# Altium footprint library Module.PcbLib: 42 footprints (part 3 of 3)
Each footprint in its own frame and in the unit in brackets; x right, y up, seen from the top. Pads: shape width x height; smd on the part's side, far side on the other; paste and mask are expansions set on the pad; w line width, h text height; cw(c..) or ccw(c..) is an arc to the next point about the centre after c.
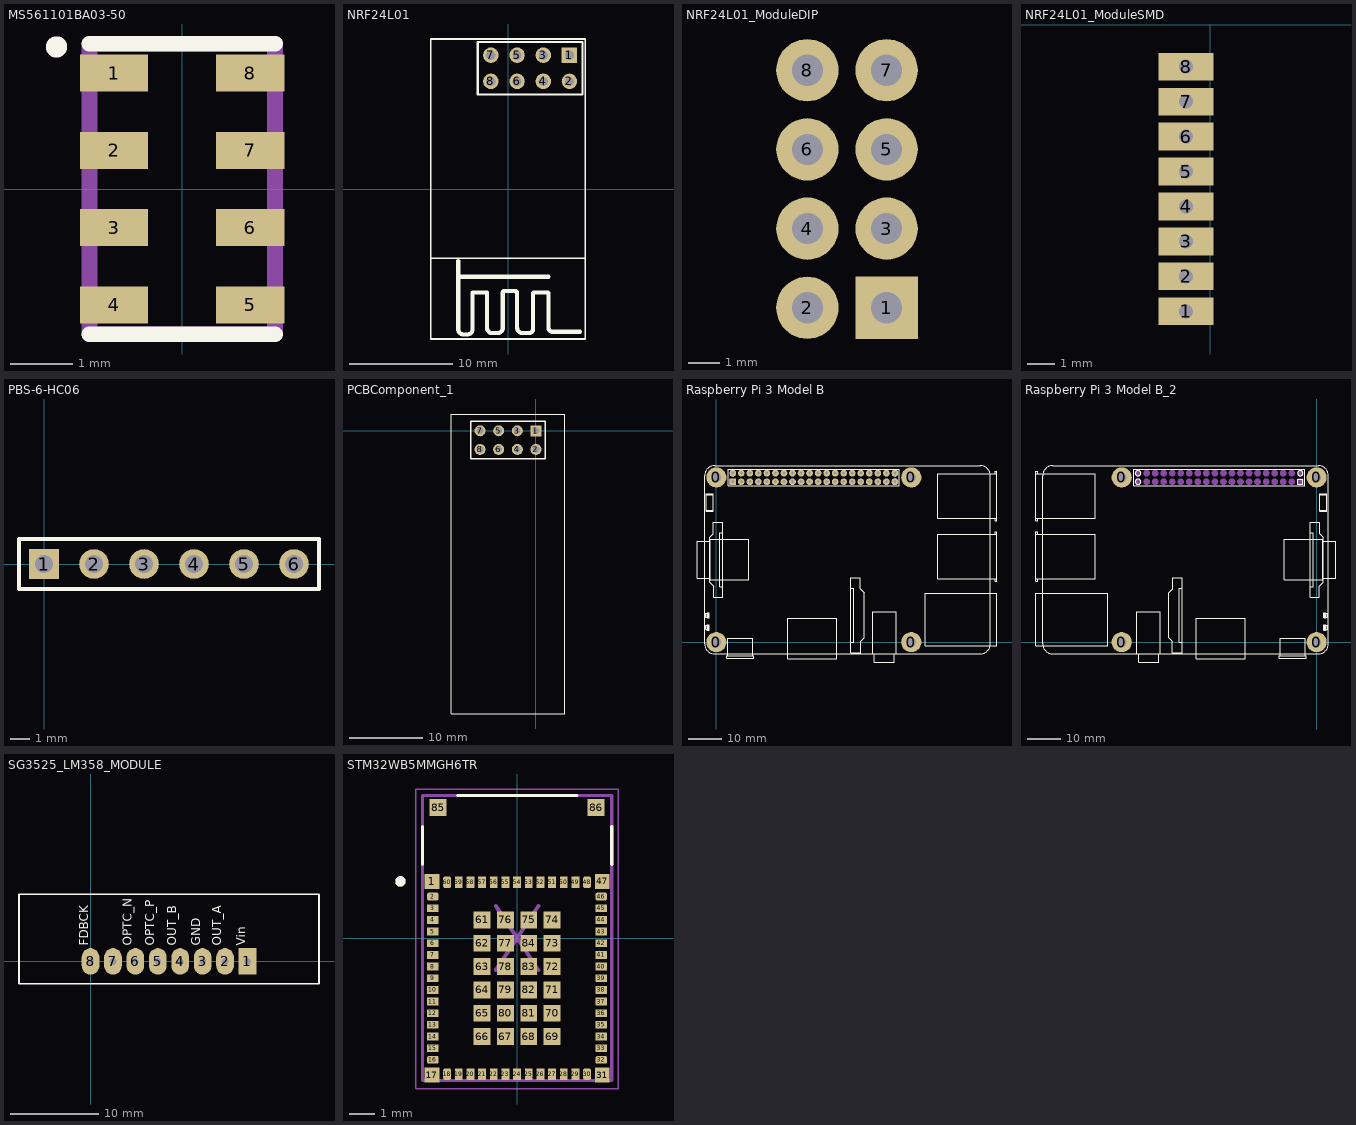
[diagram p2: the footprints below, top view; thin cyan lines are the x and y axes]

## MS561101BA03-50 [mm]
pads (8):
  rect 1.1x0.6 smd: 1(-1.1,1.875) 2(-1.1,0.625) 3(-1.1,-0.625) 4(-1.1,-1.875) 5(1.1,-1.875) 6(1.1,-0.625) 7(1.1,0.625) 8(1.1,1.875)
Top Overlay:
  circle w0.254: c-2.032,2.297 r0.045
  lines w0.254: -1.5,-2.35 1.5,-2.35 ; -1.5,2.35 1.5,2.35
Mechanical 13:
  lines w0.254: -1.5,-2.35 -1.5,2.35 1.5,2.35 1.5,-2.35 -1.5,-2.35
3D body "MS561101BA03-50.stp": height 0.95, standoff 0, extent -1.5,-2.5 1.5,2.5

## NRF24L01 [mm]
pads (8):
  rect 1.5x1.5 hole 0.9: 1(5.96,12.97)
  round 1.5 hole 0.9: 2(5.96,10.429) 3(3.42,12.97) 4(3.42,10.429) 5(0.88,12.97) 6(0.88,10.43) 7(-1.66,12.97) 8(-1.66,10.43)
Top Overlay:
  lines w0.15: -7.493,-6.731 7.493,-6.731 ; -7.493,-14.541 -7.493,14.541 7.493,14.541 7.493,-14.541 -7.493,-14.541
  lines w0.2: -2.93,9.16 7.23,9.16 7.23,14.24 -2.93,14.24 -2.93,9.16
  lines w0.4: -4.826,-8.509 3.937,-8.509 ; -4.826,-6.985 -4.826,-13.589 ccw(c-4.318,-13.589) -4.318,-14.097 -3.937,-14.097 ccw(c-3.937,-13.589) -3.429,-13.589 -3.429,-10.09 cw(c-3.372,-10.09) -3.372,-10.033 -2.089,-10.033 cw(c-2.089,-10.09) -2.032,-10.09 -2.032,-13.462 ccw(c-1.524,-13.462) -1.524,-13.97 -1.016,-13.97 ccw(c-1.016,-13.462) -0.508,-13.462 -0.508,-10.033 cw(c-0.381,-10.033) -0.381,-9.906 0.705,-9.906 cw(c0.705,-10.09) 0.889,-10.09 0.889,-13.462 ccw(c1.397,-13.462) 1.397,-13.97 2.032,-13.97 ccw(c2.032,-13.589) 2.413,-13.589 2.413,-10.16 cw(c2.54,-10.16) 2.54,-10.033 3.81,-10.033 cw(c3.81,-10.16) 3.937,-10.16 3.937,-13.462 ccw(c4.318,-13.462) 4.318,-13.843 6.985,-13.843
3D body "User Library-NRF24L01.STEP": height 8.5, standoff -3.95, extent -7.5,-14.458 7.5,14.541

## NRF24L01_ModuleDIP [mm]
pads (8):
  rect 2x2 hole 1: 1(27.94,2.54)
  round 2 hole 1: 2(25.4,2.54) 3(27.94,5.08) 4(25.4,5.08) 5(27.94,7.62) 6(25.4,7.62) 7(27.94,10.16) 8(25.4,10.16)
3D body "User Library-NRF24L01.STEP": height 3.5, standoff -8.95, extent 0,0 29,15

## NRF24L01_ModuleSMD [mm] "NRF24L01+ smd Module"
pads (8):
  rect 2x1 hole 0.5: 1(-0.889,-10.414) 2(-0.889,-9.144) 3(-0.889,-7.874) 4(-0.889,-6.604) 5(-0.889,-5.334) 6(-0.889,-4.064) 7(-0.889,-2.794) 8(-0.889,-1.524)
3D body "User Library-4-11.step": height 0.8, standoff 0, extent -18,-12 0,0

## PBS-6-HC06 [mm] "Connector; Header; 6 Position"
height 8
pads (6):
  rect 1.5x1.5 hole 0.9: 1(0,0)
  round 1.5 hole 0.9: 2(2.54,0) 3(5.08,0) 4(7.62,0) 5(10.16,0) 6(12.7,0)
Top Overlay:
  lines w0.2: -1.27,-1.27 13.97,-1.27 13.97,1.27 -1.27,1.27 -1.27,-1.27
3D body "User Library-HC05-Bluetooth.step": height 11.12, standoff 9.25, extent -1.625,-1.422 14.375,34.578
3D body "PBD-2.stp": height 8.5, standoff -3.15, extent -1.27,-1.27 3.81,1.27
3D body "PBD-2.stp": height 8.5, standoff -3.15, extent 3.81,-1.27 8.89,1.27
3D body "PBD-2.stp": height 8.5, standoff -3.15, extent 8.89,-1.27 13.97,1.27
3D body "User Library-PLS-6.step": height 12, standoff 0.46, extent -1.27,-1.27 13.97,1.27

## PCBComponent_1 [mm]
pads (8):
  rect 1.5x1.5 hole 0.9: 1(0,0)
  round 1.5 hole 0.9: 2(0,-2.54) 3(-2.54,0) 4(-2.54,-2.54) 5(-5.08,0) 6(-5.08,-2.54) 7(-7.62,0) 8(-7.62,-2.54)
Top Overlay:
  lines w0.15: -11.557,-38.608 -11.557,2.286 3.937,2.286 3.937,-38.608 -11.557,-38.608
  lines w0.2: -8.89,-3.81 1.27,-3.81 1.27,1.27 -8.89,1.27 -8.89,-3.81
3D body "User Library-NRF24+SMA.STEP": height 92.44, standoff -5.09, extent -11.493,-72.629 3.907,2.231

## Raspberry Pi 3 Model B [mm]
pads (44):
  round 6 hole 2.75 unplated: 0(0,0) 0(0,49) 0(58,0) 0(58,49)
  rect 2x2 hole 0.9: 1(4.87,47.73)
  round 2 hole 0.9: 2(4.87,50.27) 3(7.41,47.73) 4(7.41,50.27) 5(9.95,47.73) 6(9.95,50.27) 7(12.49,47.73) 8(12.49,50.27) 9(15.03,47.73) 10(15.03,50.27) 11(17.57,47.73) 12(17.57,50.27) 13(20.11,47.73) 14(20.11,50.27) 15(22.65,47.73) 16(22.65,50.27) 17(25.19,47.73) 18(25.19,50.27) 19(27.73,47.73) 20(27.73,50.27) 21(30.27,47.73) 22(30.27,50.27) 23(32.81,47.73) 24(32.81,50.27) 25(35.35,47.73) 26(35.35,50.27) 27(37.89,47.73) 28(37.89,50.27) 29(40.43,47.73) 30(40.43,50.27) 31(42.97,47.73) 32(42.97,50.27) 33(45.51,47.73) 34(45.51,50.27) 35(48.05,47.73) 36(48.05,50.27) 37(50.59,47.73) 38(50.59,50.27) 39(53.13,47.73) 40(53.13,50.27)
Top Overlay:
  circle w0.013: c4.87,50.27 r0.8
  circle w0.013: c4.87,50.27 r0.8
  circle w0.013: c53.13,50.27 r0.8
  circle w0.013: c53.13,50.27 r0.8
  circle w0.013: c53.13,47.73 r0.8
  circle w0.013: c53.13,47.73 r0.8
  circle w0.013: c58,0 r0.25
  circle w0.013: c58,0 r0.25
  circle w0.013: c0,0 r0.25
  circle w0.013: c0,0 r0.25
  circle w0.013: c58,49 r0.25
  circle w0.013: c58,49 r0.25
  circle w0.013: c0,49 r0.25
  circle w0.013: c0,49 r0.25
  lines w0.013: -3,39.2 -1,39.2 ; -3,43.8 -1,43.8 ; -2.75,3.75 -3.05,3.75 -3.15,3.85 -3.15,4.95 -3.05,5.05 -2.75,5.05 ; -2.75,3.8 -2.05,3.8 ; -2.75,5 -2.05,5 ; -2.75,7.35 -3.05,7.35 -3.15,7.45 -3.15,8.55 -3.05,8.65 -2.75,8.65 ; -2.75,7.4 -2.05,7.4 ; -2.75,8.6 -2.05,8.6 ; -2.7,4.2 -2.1,4.2 ; -2.7,7.8 -2.1,7.8 ; -2.4,3.9 -2.4,4.2 ; -2.4,4.5 -2.4,4.9 ; -2.4,7.5 -2.4,7.8 ; -2.4,8.1 -2.4,8.5 ; -1.815,19.01 -5.765,19.01 -5.765,30.01 -1.815,30.01 ; 1.95,16.5 1.05,16.5 1.05,32.5 1.95,32.5 ; 40.05,0 40.95,0 40.95,16 40.05,16 ; 83,18.93 83,18.15 83.5,18.15 83.5,32.07 ; 83,32.07 83,32.85 83.5,32.85 83.5,32.07 ; 83,36.93 83,36.15 83.5,36.15 83.5,50.07 ; 83,50.07 83,50.85 83.5,50.85 83.5,50.07 ; 83.5,18.93 65.8,18.93 65.8,32.07 83.5,32.07 ; 83.5,36.93 65.8,36.93 65.8,50.07 83.5,50.07 ; -2.4,4.2 -2.1,4.5 -2.7,4.5 -2.4,4.2 ; -2.4,7.8 -2.1,8.1 -2.7,8.1 -2.4,7.8 ; 4.07,46.93 4.07,48.53 ; 4.07,46.93 5.67,46.93 ; 4.07,46.93 4.07,48.53 ; 4.07,46.93 5.67,46.93 ; 4.07,48.53 5.67,48.53 ; 4.07,48.53 5.67,48.53 ; 5.67,46.93 5.67,48.53 ; 5.67,46.93 5.67,48.53 ; -3.5,-0.5 ccw(c-0.5,-0.5) -0.5,-3.5 78.5,-3.5 ccw(c78.5,-0.5) 81.5,-0.5 81.5,49.5 ccw(c78.5,49.5) 78.5,52.5 -0.5,52.5 ccw(c-0.5,49.5) -3.5,49.5 -3.5,-0.5 ; -3,38.9 -3,44.1 -1,44.1 -1,38.9 -3,38.9 ; -2.75,3.6 -2.75,5.2 -2.05,5.2 -2.05,3.6 -2.75,3.6 ; -2.75,7.2 -2.75,8.8 -2.05,8.8 -2.05,7.2 -2.75,7.2 ; -2,17.8 -2,31.2 -0.9,32.3 -0.9,35.7 1.95,35.7 1.95,13.3 -0.85,13.3 -0.85,16.65 -2,17.8 ; -1.815,18.61 -1.815,30.6 9.635,30.6 9.635,18.61 -1.815,18.61 ; 3.08,-4.72 11.12,-4.72 11.12,-4.1 3.08,-4.1 3.08,-4.72 ; 3.35,-4.1 10.85,-4.1 10.85,1.21 3.35,1.21 3.35,-4.1 ; 3.6,46.5 54.4,46.5 54.4,51.5 3.6,51.5 3.6,46.5 ; 21.25,-5 21.25,7.15 35.75,7.15 35.75,-5 21.25,-5 ; 40.05,-3.2 42.9,-3.2 42.9,0.2 44,1.3 44,14.7 42.85,15.85 42.85,19.2 40.05,19.2 40.05,-3.2 ; 46.5,-3.5 53.5,-3.5 53.5,9 46.5,9 46.5,-3.5 ; 47,-6 53,-6 53,-3.5 47,-3.5 47,-6 ; 62.15,-1.005 62.15,14.505 83.5,14.505 83.5,-1.005 62.15,-1.005
3D body "User Library-Raspberry Pi 3-2.step": height 17.09, standoff -1.5, extent -5.436,-4.81 84.2,52.501

## Raspberry Pi 3 Model B_2 [mm]
pads (44):
  round 6 hole 2.75 unplated: 0(-58,0) 0(-58,49) 0(0,0) 0(0,49)
  rect 2x2 on Mech1: 1(-4.87,47.73)
  round 2 on Mech1: 2(-4.87,50.27) 3(-7.41,47.73) 4(-7.41,50.27) 5(-9.95,47.73) 6(-9.95,50.27) 7(-12.49,47.73) 8(-12.49,50.27) 9(-15.03,47.73) 10(-15.03,50.27) 11(-17.57,47.73) 12(-17.57,50.27) 13(-20.11,47.73) 14(-20.11,50.27) 15(-22.65,47.73) 16(-22.65,50.27) 17(-25.19,47.73) 18(-25.19,50.27) 19(-27.73,47.73) 20(-27.73,50.27) 21(-30.27,47.73) 22(-30.27,50.27) 23(-32.81,47.73) 24(-32.81,50.27) 25(-35.35,47.73) 26(-35.35,50.27) 27(-37.89,47.73) 28(-37.89,50.27) 29(-40.43,47.73) 30(-40.43,50.27) 31(-42.97,47.73) 32(-42.97,50.27) 33(-45.51,47.73) 34(-45.51,50.27) 35(-48.05,47.73) 36(-48.05,50.27) 37(-50.59,47.73) 38(-50.59,50.27) 39(-53.13,47.73) 40(-53.13,50.27)
Top Overlay:
  circle w0.013: c-58,0 r0.25
  circle w0.013: c-58,0 r0.25
  circle w0.013: c-58,49 r0.25
  circle w0.013: c-58,49 r0.25
  circle w0.013: c-53.13,47.73 r0.8
  circle w0.013: c-53.13,47.73 r0.8
  circle w0.013: c-53.13,50.27 r0.8
  circle w0.013: c-53.13,50.27 r0.8
  circle w0.013: c-4.87,50.27 r0.8
  circle w0.013: c-4.87,50.27 r0.8
  circle w0.013: c0,0 r0.25
  circle w0.013: c0,0 r0.25
  circle w0.013: c0,49 r0.25
  circle w0.013: c0,49 r0.25
  lines w0.013: -83.5,18.93 -65.8,18.93 -65.8,32.07 -83.5,32.07 ; -83.5,36.93 -65.8,36.93 -65.8,50.07 -83.5,50.07 ; -83,18.93 -83,18.15 -83.5,18.15 -83.5,32.07 ; -83,32.07 -83,32.85 -83.5,32.85 -83.5,32.07 ; -83,36.93 -83,36.15 -83.5,36.15 -83.5,50.07 ; -83,50.07 -83,50.85 -83.5,50.85 -83.5,50.07 ; -40.05,0 -40.95,0 -40.95,16 -40.05,16 ; -1.95,16.5 -1.05,16.5 -1.05,32.5 -1.95,32.5 ; 1,39.2 3,39.2 ; 1,43.8 3,43.8 ; 1.815,19.01 5.765,19.01 5.765,30.01 1.815,30.01 ; 2.05,3.8 2.75,3.8 ; 2.05,5 2.75,5 ; 2.05,7.4 2.75,7.4 ; 2.05,8.6 2.75,8.6 ; 2.1,4.2 2.7,4.2 ; 2.1,7.8 2.7,7.8 ; 2.4,3.9 2.4,4.2 ; 2.4,4.5 2.4,4.9 ; 2.4,7.5 2.4,7.8 ; 2.4,8.1 2.4,8.5 ; 2.75,3.75 3.05,3.75 3.15,3.85 3.15,4.95 3.05,5.05 2.75,5.05 ; 2.75,7.35 3.05,7.35 3.15,7.45 3.15,8.55 3.05,8.65 2.75,8.65 ; -5.67,46.93 -5.67,48.53 ; -5.67,46.93 -5.67,48.53 ; -5.67,46.93 -4.07,46.93 ; -5.67,46.93 -4.07,46.93 ; -5.67,48.53 -4.07,48.53 ; -5.67,48.53 -4.07,48.53 ; -4.07,46.93 -4.07,48.53 ; -4.07,46.93 -4.07,48.53 ; 2.4,4.2 2.7,4.5 2.1,4.5 2.4,4.2 ; 2.4,7.8 2.7,8.1 2.1,8.1 2.4,7.8 ; -83.5,-1.005 -83.5,14.505 -62.15,14.505 -62.15,-1.005 -83.5,-1.005 ; -81.5,-0.5 ccw(c-78.5,-0.5) -78.5,-3.5 0.5,-3.5 ccw(c0.5,-0.5) 3.5,-0.5 3.5,49.5 ccw(c0.5,49.5) 0.5,52.5 -78.5,52.5 ccw(c-78.5,49.5) -81.5,49.5 -81.5,-0.5 ; -54.4,46.5 -54.4,51.5 -3.6,51.5 -3.6,46.5 -54.4,46.5 ; -53.5,-3.5 -53.5,9 -46.5,9 -46.5,-3.5 -53.5,-3.5 ; -53,-6 -53,-3.5 -47,-3.5 -47,-6 -53,-6 ; -44,1.3 -42.9,0.2 -42.9,-3.2 -40.05,-3.2 -40.05,19.2 -42.85,19.2 -42.85,15.85 -44,14.7 -44,1.3 ; -35.75,-5 -35.75,7.15 -21.25,7.15 -21.25,-5 -35.75,-5 ; -11.12,-4.72 -11.12,-4.1 -3.08,-4.1 -3.08,-4.72 -11.12,-4.72 ; -10.85,-4.1 -10.85,1.21 -3.35,1.21 -3.35,-4.1 -10.85,-4.1 ; -9.635,18.61 -9.635,30.6 1.815,30.6 1.815,18.61 -9.635,18.61 ; -1.95,13.3 -1.95,35.7 0.9,35.7 0.9,32.3 2,31.2 2,17.8 0.85,16.65 0.85,13.3 -1.95,13.3 ; 1,38.9 1,44.1 3,44.1 3,38.9 1,38.9 ; 2.05,3.6 2.75,3.6 2.75,5.2 2.05,5.2 2.05,3.6 ; 2.05,7.2 2.75,7.2 2.75,8.8 2.05,8.8 2.05,7.2
3D body: height 11, standoff 0, extent -3,46 3,52
3D body: height 11, standoff 0, extent -3,-3 3,3
3D body: height 11, standoff 0, extent -61,-3 -55,3
3D body "User Library-Raspberry Pi 3-2.step": height 14.35, standoff -4.24, extent -84.2,-4.855 5.437,52.455
3D body: height 11, standoff 0, extent -61,46 -55,52

## SG3525_LM358_MODULE [mm]
pads (8):
  rect 2x3 hole 0.762: 1(17.78,0)
  oval 2x3 hole 0.762: 2(15.24,0) 3(12.7,0) 4(10.16,0) 5(7.62,0) 6(5.08,0) 7(2.54,0) 8(0,0)
Top Overlay:
  lines w0.2: 25.4,7.62 25.89,7.62 ; 25.89,7.62 -8.11,7.62 -8.11,-2.54 25.89,-2.54 25.89,7.62
  text "OUT_A" at 14.819,1.778 h1
  text "Vin" at 17.526,1.778 h1
  text "GND" at 12.446,1.778 h1
  text "OUT_B" at 9.739,1.778 h1
  text "OPTC_P" at 7.199,1.778 h1
  text "OPTC_N" at 4.659,1.778 h1
  text "FDBCK" at -0.254,1.778 h1
3D body: height 28, standoff 0, extent -8.11,-2.54 25.89,7.62

## STM32WB5MMGH6TR [mm]
pads (86):
  rect 0.575x0.575 smd mask+0.05: 1(-3.287,2.187) 17(-3.287,-5.287) 31(3.287,-5.287) 47(3.287,2.187)
  rrect50% 0.45x0.3 smd mask+0: 2(-3.25,1.6) 16(-3.25,-4.7) 32(3.25,-4.7) 46(3.25,1.6)
  rect 0.45x0.3 smd mask+0: 3(-3.25,1.15) 4(-3.25,0.7) 5(-3.25,0.25) 6(-3.25,-0.2) 7(-3.25,-0.65) 8(-3.25,-1.1) 9(-3.25,-1.55) 10(-3.25,-2) 11(-3.25,-2.45) 12(-3.25,-2.9) 13(-3.25,-3.35) 14(-3.25,-3.8) 15(-3.25,-4.25) 33(3.25,-4.25) 34(3.25,-3.8) 35(3.25,-3.35) 36(3.25,-2.9) 37(3.25,-2.45) 38(3.25,-2) 39(3.25,-1.55) 40(3.25,-1.1) 41(3.25,-0.65) 42(3.25,-0.2) 43(3.25,0.25) 44(3.25,0.7) 45(3.25,1.15)
  rrect50% 0.3x0.45 smd mask+0: 18(-2.7,-5.25) 30(2.7,-5.25) 48(2.7,2.15) 60(-2.7,2.15)
  rect 0.3x0.45 smd mask+0: 19(-2.25,-5.25) 20(-1.8,-5.25) 21(-1.35,-5.25) 22(-0.9,-5.25) 23(-0.45,-5.25) 24(0,-5.25) 25(0.45,-5.25) 26(0.9,-5.25) 27(1.35,-5.25) 28(1.8,-5.25) 29(2.25,-5.25) 49(2.25,2.15) 50(1.8,2.15) 51(1.35,2.15) 52(0.9,2.15) 53(0.45,2.15) 54(0,2.15) 55(-0.45,2.15) 56(-0.9,2.15) 57(-1.35,2.15) 58(-1.8,2.15) 59(-2.25,2.15)
  rect 0.65x0.65 smd mask+0.05: 61(-1.35,0.7) 62(-1.35,-0.2) 63(-1.35,-1.1) 64(-1.35,-2) 65(-1.35,-2.9) 66(-1.35,-3.8) 67(-0.45,-3.8) 68(0.45,-3.8) 69(1.35,-3.8) 70(1.35,-2.9) 71(1.35,-2) 72(1.35,-1.1) 73(1.35,-0.2) 74(1.35,0.7) 75(0.45,0.7) 76(-0.45,0.7) 77(-0.45,-0.2) 78(-0.45,-1.1) 79(-0.45,-2) 80(-0.45,-2.9) 81(0.45,-2.9) 82(0.45,-2) 83(0.45,-1.1) 84(0.45,-0.2)
  rect 0.65x0.65 smd: 85(-3.05,5.035) 86(3.05,5.035)
Top Overlay:
  circle w0.2: c-4.5,2.187 r0.1
  lines w0.127: -3.65,2.85 -3.65,4.3 ; -2.3,5.5 2.3,5.5 ; 3.65,2.85 3.65,4.3
Top Solder:
  drawing of 56 lines, arcs and shapes, not listed
Mechanical 13:
  circle w0.2: c-4.5,2.187 r0.1
  lines w0.127: -3.65,-5.5 -3.65,5.5 3.65,5.5 3.65,-5.5 -3.65,-5.5
Mechanical 15:
  lines w0.05: -3.9,-5.825 3.9,-5.825 3.9,5.75 -3.9,5.75 -3.9,-5.825
  lines w0.15: -0.824,-1.242 0.824,1.242 ; -0.824,1.242 0.824,-1.242
3D body "STM32WB5MMGH6TR--3DModel-STEP-56544.STEP": height 1.43, standoff -0.01, extent -3.65,-5.5 3.65,5.5